# Altium footprint library Transformers.PcbLib: 102 footprints (part 3 of 7)
Each footprint in its own frame and in the unit in brackets; x right, y up, seen from the top. Pads: shape width x height; smd on the part's side, far side on the other; paste and mask are expansions set on the pad; w line width, h text height; cw(c..) or ccw(c..) is an arc to the next point about the centre after c.
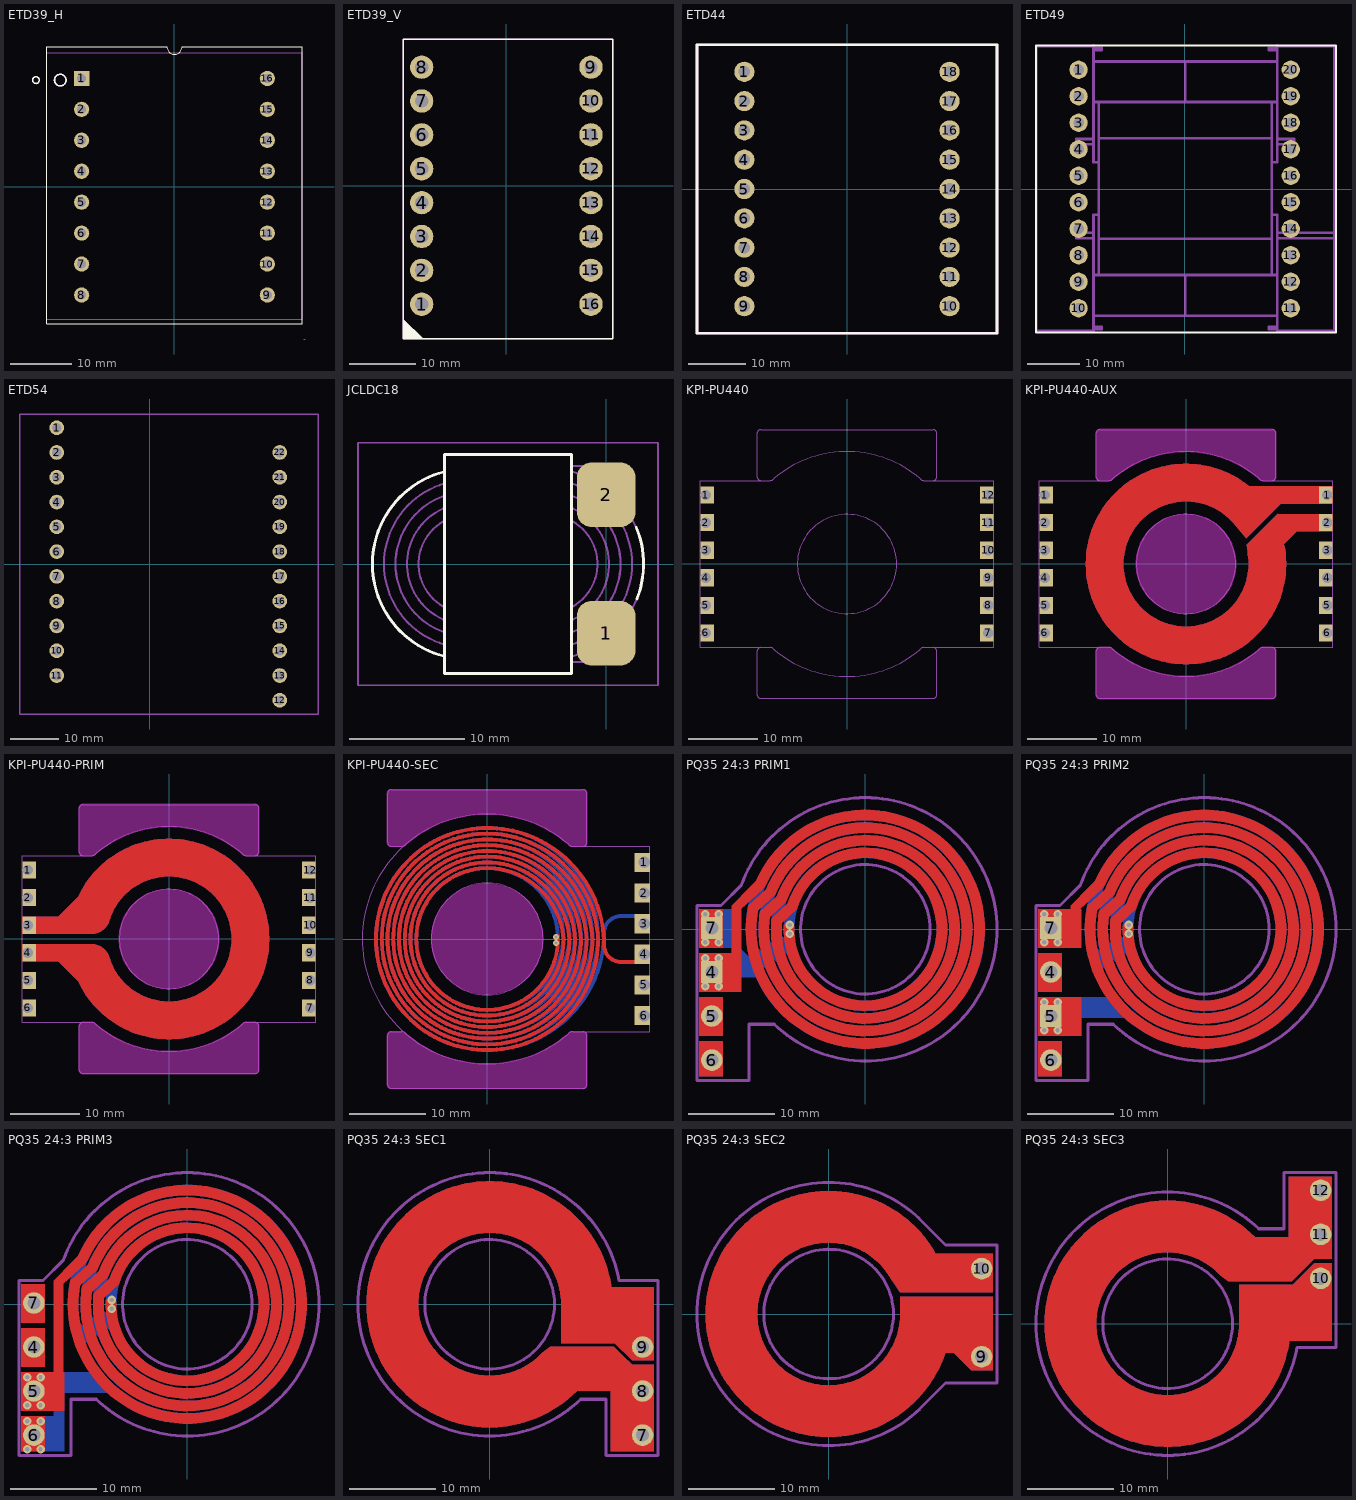
[diagram p2: the footprints below, top view; thin cyan lines are the x and y axes]

## ETD39_H [mm] "THT, Body 41.90X49.0mm, 16Pins,Pitch 5.0mm"
height 31.75
pads (16):
  rect 2.5x2.5 hole 1.5: 1(-15.24,17.78)
  round 2.5 hole 1.5: 2(-15.24,12.7) 3(-15.24,7.62) 4(-15.24,2.54) 5(-15.24,-2.54) 6(-15.24,-7.62) 7(-15.24,-12.7) 8(-15.24,-17.78) 9(15.24,-17.78) 10(15.24,-12.7) 11(15.24,-7.62) 12(15.24,-2.54) 13(15.24,2.54) 14(15.24,7.62) 15(15.24,12.7) 16(15.24,17.78)
Top Overlay:
  circle w0.254: c-22.75,17.5 r0.552
  circle w0.254: c-18.75,17.5 r0.95
  lines w0.2: -21,-22.5 -21,23 -1.25,23 ccw(c0,23) 1.25,23 21,23 21,-22.5 -21,-22.5
Top Assembly:
  circle w0.254: c-18.75,17.5 r0.95
  lines w0.2: -21,-21.75 21,-21.75 21,22 -21,22 -21,-21.75
Top Component Outline (Mech15):
  lines w0.2: 21.25,-25 21.5,-25
3D body "070-5724.stp": height 32.31, standoff -3.79, extent -20.5,-21.25 20.5,21.45

## ETD39_V [mm]
pads (16):
  round 3.5 hole 2 paste-25.4: 1(-12.7,-17.78) 2(-12.7,-12.7) 3(-12.7,-7.62) 4(-12.7,-2.54) 5(-12.7,2.54) 6(-12.7,7.62) 7(-12.7,12.7) 8(-12.7,17.78) 9(12.7,17.78) 10(12.7,12.7) 11(12.7,7.62) 12(12.7,2.54) 13(12.7,-2.54) 14(12.7,-7.62) 15(12.7,-12.7) 16(12.7,-17.78)
Top Overlay:
  region: -15.5,-20 -12.5,-23 -13.5,-23 -15.5,-23
  lines w0.2: -15.5,-23 16,-23 16,22 -15.5,22 -15.5,-23
Top Assembly:
  region: -15.5,-20 -12.5,-23 -13.5,-23 -15.5,-23
  lines w0.2: -15.5,-23 -15.5,22 16,22 16,-23 -15.5,-23
3D body "ETD39[ver].SLDPRT": height 53.92, standoff -0.55, extent -14,-22.02 14.4,21.78

## ETD44 [mm]
pads (18):
  round 3.5 hole 2 unplated: 1(-17.78,20.32) 2(-17.78,15.24) 3(-17.78,10.16) 4(-17.78,5.08) 5(-17.78,0) 6(-17.78,-5.08) 7(-17.78,-10.16) 8(-17.78,-15.24) 9(-17.78,-20.32) 10(17.78,-20.32) 11(17.78,-15.24) 12(17.78,-10.16) 13(17.78,-5.08) 14(17.78,0) 15(17.78,5.08) 16(17.78,10.16) 17(17.78,15.24) 18(17.78,20.32)
Top Overlay:
  lines w0.5: -26,-25 26,-25 26,25 -26,25 -26,-25
Top Assembly:
  lines w0.5: -26,-25 -26,25 26,25 26,-25 -26,-25
3D body "ETD44 Transformer assembly.STEP": height 40.51, standoff -3.75, extent -26.1,-24.8 26.1,24.8

## ETD49 [mm]
pads (20):
  round 3.5 hole 2: 1(-20.32,22.86) 2(-20.32,17.78) 3(-20.32,12.7) 4(-20.32,7.62) 5(-20.32,2.54) 6(-20.32,-2.54) 7(-20.32,-7.62) 8(-20.32,-12.7) 9(-20.32,-17.78) 10(-20.32,-22.86) 11(20.32,-22.86) 12(20.32,-17.78) 13(20.32,-12.7) 14(20.32,-7.62) 15(20.32,-2.54) 16(20.32,2.54) 17(20.32,7.62) 18(20.32,12.7) 19(20.32,17.78) 20(20.32,22.86)
Top Overlay:
  lines w0.3: -28.5,-27.5 -28.5,27.5 29,27.5 29,-27.5 -28.5,-27.5
Top Assembly:
  lines w0.5: -17.667,-27.158 -17.48,-27.258 -17.48,-27.158 ; -17.667,27.342 -17.48,27.442 -17.48,27.342 ; -17.48,-26.858 -15.88,-26.858 -15.88,-26.458 -17.48,-26.458 ; -17.48,-24.258 0.12,-24.258 ; -17.48,-16.491 0.12,-16.491 ; -17.48,-9.408 -20.78,-9.408 -20.78,-8.408 -17.48,-8.408 ; -17.48,8.592 -20.78,8.592 -20.78,9.592 -17.48,9.592 ; -17.48,16.676 0.12,16.676 ; -17.48,24.442 0.12,24.442 ; -17.48,26.642 -15.88,26.642 -15.88,27.042 -17.48,27.042 ; -16.48,-16.491 -16.48,-4.908 ; -16.48,-9.508 16.72,-9.508 ; -16.48,9.692 16.72,9.692 ; -16.48,16.676 -16.48,5.092 ; 16.72,-16.491 16.72,-4.908 ; 16.72,16.676 16.72,5.092 ; 17.72,-26.858 16.12,-26.858 16.12,-26.458 17.72,-26.458 ; 17.72,-24.258 0.12,-24.258 ; 17.72,-16.491 0.12,-16.491 ; 17.72,-9.408 28.72,-9.408 ; 17.72,-8.408 28.72,-8.408 ; 17.72,8.592 21.02,8.592 21.02,9.592 17.72,9.592 ; 17.72,16.676 0.12,16.676 ; 17.72,24.442 0.12,24.442 ; 17.72,26.642 16.12,26.642 16.12,27.042 17.72,27.042 ; 17.908,-27.158 17.72,-27.258 17.72,-27.158 ; 17.908,27.342 17.72,27.442 17.72,27.342 ; -17.48,-27.158 -28.48,-27.158 -28.48,27.342 -17.48,27.342 ; -17.48,-27.158 -17.48,-14.394 -17.48,-4.908 -16.48,-4.908 ; -17.48,27.342 -17.48,14.578 -17.48,5.092 -16.48,5.092 ; -16.48,-4.908 -16.48,5.092 ; 0.12,-24.258 0.12,-16.491 ; 0.12,16.676 0.12,24.442 ; 16.72,-4.908 16.72,5.092 ; 16.72,-4.908 17.72,-4.908 17.72,-14.394 17.72,-27.158 ; 16.72,5.092 17.72,5.092 17.72,14.578 17.72,27.342 ; 17.72,-27.158 28.72,-27.158 28.72,-9.408 ; 17.72,27.342 28.72,27.342 28.72,-8.408 ; 28.72,-9.408 28.72,-8.408
3D body "User Library-ETD49_NO_AIRGAP.STEP": height 40.74, standoff -3.86, extent -28.6,-27.35 28.6,27.35

## ETD54 [mm]
pads (22):
  round 3 hole 2: 1(-19.05,27.94) 2(-19.05,22.86) 3(-19.05,17.78) 4(-19.05,12.7) 5(-19.05,7.62) 6(-19.05,2.54) 7(-19.05,-2.54) 8(-19.05,-7.62) 9(-19.05,-12.7) 10(-19.05,-17.78) 11(-19.05,-22.86) 12(26.67,-27.94) 13(26.67,-22.86) 14(26.67,-17.78) 15(26.67,-12.7) 16(26.67,-7.62) 17(26.67,-2.54) 18(26.67,2.54) 19(26.67,7.62) 20(26.67,12.7) 21(26.67,17.78) 22(26.67,22.86)
Top Assembly:
  lines w0.3: -26.67,-30.75 -26.67,30.75 34.6,30.75 34.6,-30.75 -26.67,-30.75
3D body "ETD54-K-H-22P-FUAN.STEP": height 45.55, standoff -4.2, extent -26.6,-30.75 34.6,30.75
3D body "ER64-25.4-50.8A.STEP": height 25.4, standoff -25.4, extent 53.2,26.2 117.2,38.9

## JCLDC18 [mm]
pads (2):
  rrect50% 5.08x5.588 smd: 1(0,-6) 2(0,6)
Top Overlay:
  lines w0.254: -13.995,-8.001 cw(c-12,0) -13.995,8.001 ; 2.613,3.169 cw(c-5,0) 2.662,-3.049 ; -14,-9.5 -3,-9.5 -3,9.5 -14,9.5 -14,-9.5
Top Assembly:
  lines w0.178: -14.134,-4.792 cw(c-12,0) -14.134,4.792 ; -14.104,-3.688 cw(c-12,0) -14.104,3.688 ; -13.995,-8.001 cw(c-12,0) -13.995,8.001 ; -13.985,-6.969 cw(c-12,0) -13.985,6.969 ; -13.972,-5.927 cw(c-12,0) -13.972,5.927 ; -3.028,-5.927 ccw(c-5,0) -3.028,5.927 ; -3.015,-6.969 ccw(c-5,0) -3.015,6.969 ; -3.005,-8.001 ccw(c-5,0) -3.005,8.001 ; -3,-8.5 1.5,-8.5 2,-8.5 2,-4.5 ; -3,8.5 2,8.5 2,4.5 ; -2.896,-3.688 ccw(c-5,0) -2.896,3.688 ; -2.866,-4.792 ccw(c-5,0) -2.866,4.792 ; -14,-9.5 -3,-9.5 -3,9.5 -14,9.5 -14,-9.5
Top Component Outline (Mech15):
  lines w0.15: -21.5,-10.5 4.5,-10.5 4.5,10.5 -21.5,10.5 -21.5,-10.5
3D body: height 5, standoff 1, extent -20.027,-7.5 2.973,0
3D body: height 5, standoff 1, extent -20,0 3,7.5
3D body: height 6, standoff 0.5, extent -14,-9.5 -3,9.5

## KPI-PU440 [mm]
pads (12):
  rect 2x2.5 hole 1.5 copper offset 0.25,0: 1(-20.5,10) 2(-20.5,6) 3(-20.5,2) 4(-20.5,-2) 5(-20.5,-6) 6(-20.5,-10)
  rect 2x2.5 hole 1.5 copper offset -0.25,0: 7(20.5,-10) 8(20.5,-6) 9(20.5,-2) 10(20.5,2) 11(20.5,6) 12(20.5,10)
Mechanical 2:
  circle w0.15: c0,0 r7.2
  lines w0.15: -0.251,-16.298 ccw(c0,0) 10.562,-12.415 10.679,-12.299 ; -0.251,16.298 cw(c0,0) 10.562,12.415 10.679,12.299 ; 0.251,-16.298 cw(c0,0) -10.562,-12.415 -10.679,-12.299 ccw(c-11.15,-12.771) -11.15,-12.103 -12.501,-12.103 -21.25,-12.103 -21.25,12.103 -12.501,12.103 -11.15,12.103 ccw(c-11.15,12.771) -10.679,12.299 -10.562,12.416 cw(c0,0) 0.251,16.298 ; 21.3,-0.5 21.3,12.103 12.501,12.103 ; 21.3,0.5 21.3,-12.103 12.501,-12.103 ; 10.679,-12.299 cw(c11.15,-12.771) 11.15,-12.103 ; 10.679,-12.299 cw(c11.15,-12.771) 11.15,-12.103 ; 10.679,12.299 ccw(c11.15,12.771) 11.15,12.103 ; 10.679,12.299 ccw(c11.15,12.771) 11.15,12.103 ; 11.15,-12.103 12.501,-12.103 ; 11.15,-12.103 12.501,-12.103 ; 11.15,12.103 12.501,12.103 ; 11.15,12.103 12.501,12.103
Top Assembly:
  circle w0.15: c0,0 r7.2
  lines w0.15: -0.251,16.298 cw(c0,0) 10.561,12.416 10.678,12.299 ccw(c11.15,12.771) 11.15,12.103 12.5,12.103 ccw(c12.5,12.603) 13,12.603 13,19 ccw(c12.5,19) 12.5,19.5 -12.5,19.5 ccw(c-12.5,19) -13,19 -13,12.603 ccw(c-12.5,12.603) -12.5,12.103 -11.15,12.103 ccw(c-11.15,12.771) -10.679,12.299 -10.562,12.416 cw(c0,0) 0.251,16.298 ; -13,-19 ccw(c-12.5,-19) -12.5,-19.5 ; -13,-19 ccw(c-12.5,-19) -12.5,-19.5 ; -13,-19 -13,-12.603 ; -13,-19 -13,-12.603 ; -13,-12.603 cw(c-12.5,-12.603) -12.5,-12.103 ; -13,-12.603 cw(c-12.5,-12.603) -12.5,-12.103 ; -12.5,-19.5 12.5,-19.5 ; -12.5,-19.5 12.5,-19.5 ; -12.5,-12.103 -11.15,-12.103 ; -12.5,-12.103 -11.15,-12.103 ; -11.15,-12.103 cw(c-11.15,-12.771) -10.679,-12.299 ; -11.15,-12.103 cw(c-11.15,-12.771) -10.679,-12.299 ; -10.679,-12.299 -10.562,-12.416 ; -10.679,-12.299 -10.562,-12.416 ; -10.561,-12.416 ccw(c0,0) 0.251,-16.298 cw(c0,0) -10.561,-12.416 ; 10.561,-12.416 cw(c0,0) -0.251,-16.298 ccw(c0,0) 10.561,-12.416 ; 10.561,-12.416 10.678,-12.299 ; 10.561,-12.416 10.678,-12.299 ; 10.678,-12.299 cw(c11.15,-12.771) 11.15,-12.103 ; 10.678,-12.299 cw(c11.15,-12.771) 11.15,-12.103 ; 11.15,-12.103 12.5,-12.103 ; 11.15,-12.103 12.5,-12.103 ; 12.5,-19.5 ccw(c12.5,-19) 13,-19 ; 12.5,-19.5 ccw(c12.5,-19) 13,-19 ; 12.5,-12.103 cw(c12.5,-12.603) 13,-12.603 ; 12.5,-12.103 cw(c12.5,-12.603) 13,-12.603 ; 13,-19 13,-12.603 ; 13,-19 13,-12.603
3D body "ER38.1-16-25.STEP": height 17, standoff 9, extent -12.7,-19.05 12.7,19.05
3D body "ER38.1-16-25.STEP": height -2, standoff -10, extent -12.7,-19.05 12.7,19.05

## KPI-PU440-AUX [mm]
pads (12):
  rect 2x2.5 hole 1.5 copper offset 0.25,0: 1(-20.5,10) 2(-20.5,6) 3(-20.5,2) 4(-20.5,-2) 5(-20.5,-6) 6(-20.5,-10)
  rect 2x2.5 hole 1.5 copper offset -0.25,0: 1(20.5,10) 2(20.5,6) 3(20.5,2) 4(20.5,-2) 5(20.5,-6) 6(20.5,-10)
Top Layer:
  region: 13.275,7.25 21.3,7.25 21.3,4.75 16.025,4.75 12.075,0.8 9.117,0.8 8.839,2.814
  region: 6.882,6 8.7,3.7 13.75,8.75 21.3,8.75 21.3,11.25 8.828,11.25 8.7,10.325
  lines w5.5: 8.837,7.82 ccw(c0,0) 0,11.8 ccw(c0,0) -11.8,0 ccw(c0,0) 0,-11.8 ccw(c0,0) 11.666,1.776
  text "5" at -18,11 h1.5
Bottom Layer:
  region: 6.882,6 8.7,3.7 13.75,8.75 21.3,8.75 21.3,11.25 8.828,11.25 8.7,10.325
  region: 13.275,7.25 21.3,7.25 21.3,4.75 16.025,4.75 12.075,0.8 9.117,0.8 8.839,2.814
  lines w5.5: 8.837,7.82 ccw(c0,0) 0,11.8 ccw(c0,0) -11.8,0 ccw(c0,0) 0,-11.8 ccw(c0,0) 11.666,1.776
Keep-Out Layer:
  drawing of 3 lines, arcs and shapes, not listed
Mechanical 2:
  circle w0.15: c0,0 r7.2
  lines w0.15: -0.251,-16.298 ccw(c0,0) 10.562,-12.415 10.679,-12.299 ; -0.251,16.298 cw(c0,0) 10.562,12.415 10.679,12.299 ; 0.251,-16.298 cw(c0,0) -10.562,-12.415 -10.679,-12.299 ccw(c-11.15,-12.771) -11.15,-12.103 -12.501,-12.103 -21.25,-12.103 -21.25,12.103 -12.501,12.103 -11.15,12.103 ccw(c-11.15,12.771) -10.679,12.299 -10.562,12.416 cw(c0,0) 0.251,16.298 ; 21.3,-0.5 21.3,12.103 12.501,12.103 ; 21.3,0.5 21.3,-12.103 12.501,-12.103 ; 10.679,-12.299 cw(c11.15,-12.771) 11.15,-12.103 ; 10.679,-12.299 cw(c11.15,-12.771) 11.15,-12.103 ; 10.679,12.299 ccw(c11.15,12.771) 11.15,12.103 ; 10.679,12.299 ccw(c11.15,12.771) 11.15,12.103 ; 11.15,-12.103 12.501,-12.103 ; 11.15,-12.103 12.501,-12.103 ; 11.15,12.103 12.501,12.103 ; 11.15,12.103 12.501,12.103
Top Assembly:
  circle w0.15: c0,0 r7.2
  lines w0.15: -0.251,16.298 cw(c0,0) 10.561,12.416 10.678,12.299 ccw(c11.15,12.771) 11.15,12.103 12.5,12.103 ccw(c12.5,12.603) 13,12.603 13,19 ccw(c12.5,19) 12.5,19.5 -12.5,19.5 ccw(c-12.5,19) -13,19 -13,12.603 ccw(c-12.5,12.603) -12.5,12.103 -11.15,12.103 ccw(c-11.15,12.771) -10.679,12.299 -10.562,12.416 cw(c0,0) 0.251,16.298 ; -13,-19 ccw(c-12.5,-19) -12.5,-19.5 ; -13,-19 ccw(c-12.5,-19) -12.5,-19.5 ; -13,-19 -13,-12.603 ; -13,-19 -13,-12.603 ; -13,-12.603 cw(c-12.5,-12.603) -12.5,-12.103 ; -13,-12.603 cw(c-12.5,-12.603) -12.5,-12.103 ; -12.5,-19.5 12.5,-19.5 ; -12.5,-19.5 12.5,-19.5 ; -12.5,-12.103 -11.15,-12.103 ; -12.5,-12.103 -11.15,-12.103 ; -11.15,-12.103 cw(c-11.15,-12.771) -10.679,-12.299 ; -11.15,-12.103 cw(c-11.15,-12.771) -10.679,-12.299 ; -10.679,-12.299 -10.562,-12.416 ; -10.679,-12.299 -10.562,-12.416 ; -10.561,-12.416 ccw(c0,0) 0.251,-16.298 cw(c0,0) -10.561,-12.416 ; 10.561,-12.416 cw(c0,0) -0.251,-16.298 ccw(c0,0) 10.561,-12.416 ; 10.561,-12.416 10.678,-12.299 ; 10.561,-12.416 10.678,-12.299 ; 10.678,-12.299 cw(c11.15,-12.771) 11.15,-12.103 ; 10.678,-12.299 cw(c11.15,-12.771) 11.15,-12.103 ; 11.15,-12.103 12.5,-12.103 ; 11.15,-12.103 12.5,-12.103 ; 12.5,-19.5 ccw(c12.5,-19) 13,-19 ; 12.5,-19.5 ccw(c12.5,-19) 13,-19 ; 12.5,-12.103 cw(c12.5,-12.603) 13,-12.603 ; 12.5,-12.103 cw(c12.5,-12.603) 13,-12.603 ; 13,-19 13,-12.603 ; 13,-19 13,-12.603
3D body "ER38.1-16-25.STEP": height 5, standoff -3, extent -12.7,-19.05 12.7,19.05

## KPI-PU440-PRIM [mm]
pads (12):
  rect 2x2.5 hole 1.5 copper offset 0.25,0: 1(-20.5,10) 2(-20.5,6) 3(-20.5,2) 4(-20.5,-2) 5(-20.5,-6) 6(-20.5,-10)
  rect 2x2.5 hole 1.5 copper offset -0.25,0: 7(20.5,-10) 8(20.5,-6) 9(20.5,-2) 10(20.5,2) 11(20.5,6) 12(20.5,10)
Top Layer:
  region: -10.751,0.749 -21.3,0.75 -21.3,3.25 -16.025,3.25 -12.075,7.2 -9.117,7.2 -8.533,2.967
  region: -10.751,-0.749 -21.3,-0.75 -21.3,-3.25 -16.025,-3.25 -12.075,-7.2 -9.117,-7.2 -8.533,-2.967
  lines w5.5: -11.269,-3.5 ccw(c0,0) 0,-11.8 ccw(c0,0) 11.8,0 ccw(c0,0) 0,11.8 ccw(c0,0) -11.267,3.505
  text "5" at -18,11 h1.5
Bottom Layer:
  region: -10.751,-0.749 -21.3,-0.75 -21.3,-3.25 -16.025,-3.25 -12.075,-7.2 -9.117,-7.2 -8.533,-2.967
  region: -10.751,0.749 -21.3,0.75 -21.3,3.25 -16.025,3.25 -12.075,7.2 -9.117,7.2 -8.533,2.967
  lines w5.5: -11.269,-3.5 ccw(c0,0) 0,-11.8 ccw(c0,0) 11.8,0 ccw(c0,0) 0,11.8 ccw(c0,0) -11.267,3.505
Keep-Out Layer:
  drawing of 3 lines, arcs and shapes, not listed
Mechanical 2:
  circle w0.15: c0,0 r7.2
  lines w0.15: -0.251,-16.298 ccw(c0,0) 10.562,-12.415 10.679,-12.299 ; -0.251,16.298 cw(c0,0) 10.562,12.415 10.679,12.299 ; 0.251,-16.298 cw(c0,0) -10.562,-12.415 -10.679,-12.299 ccw(c-11.15,-12.771) -11.15,-12.103 -12.501,-12.103 -21.25,-12.103 -21.25,12.103 -12.501,12.103 -11.15,12.103 ccw(c-11.15,12.771) -10.679,12.299 -10.562,12.416 cw(c0,0) 0.251,16.298 ; 21.3,-0.5 21.3,12.103 12.501,12.103 ; 21.3,0.5 21.3,-12.103 12.501,-12.103 ; 10.679,-12.299 cw(c11.15,-12.771) 11.15,-12.103 ; 10.679,-12.299 cw(c11.15,-12.771) 11.15,-12.103 ; 10.679,12.299 ccw(c11.15,12.771) 11.15,12.103 ; 10.679,12.299 ccw(c11.15,12.771) 11.15,12.103 ; 11.15,-12.103 12.501,-12.103 ; 11.15,-12.103 12.501,-12.103 ; 11.15,12.103 12.501,12.103 ; 11.15,12.103 12.501,12.103
Top Assembly:
  circle w0.15: c0,0 r7.2
  lines w0.15: -0.251,16.298 cw(c0,0) 10.561,12.416 10.678,12.299 ccw(c11.15,12.771) 11.15,12.103 12.5,12.103 ccw(c12.5,12.603) 13,12.603 13,19 ccw(c12.5,19) 12.5,19.5 -12.5,19.5 ccw(c-12.5,19) -13,19 -13,12.603 ccw(c-12.5,12.603) -12.5,12.103 -11.15,12.103 ccw(c-11.15,12.771) -10.679,12.299 -10.562,12.416 cw(c0,0) 0.251,16.298 ; -13,-19 ccw(c-12.5,-19) -12.5,-19.5 ; -13,-19 ccw(c-12.5,-19) -12.5,-19.5 ; -13,-19 -13,-12.603 ; -13,-19 -13,-12.603 ; -13,-12.603 cw(c-12.5,-12.603) -12.5,-12.103 ; -13,-12.603 cw(c-12.5,-12.603) -12.5,-12.103 ; -12.5,-19.5 12.5,-19.5 ; -12.5,-19.5 12.5,-19.5 ; -12.5,-12.103 -11.15,-12.103 ; -12.5,-12.103 -11.15,-12.103 ; -11.15,-12.103 cw(c-11.15,-12.771) -10.679,-12.299 ; -11.15,-12.103 cw(c-11.15,-12.771) -10.679,-12.299 ; -10.679,-12.299 -10.562,-12.416 ; -10.679,-12.299 -10.562,-12.416 ; -10.561,-12.416 ccw(c0,0) 0.251,-16.298 cw(c0,0) -10.561,-12.416 ; 10.561,-12.416 cw(c0,0) -0.251,-16.298 ccw(c0,0) 10.561,-12.416 ; 10.561,-12.416 10.678,-12.299 ; 10.561,-12.416 10.678,-12.299 ; 10.678,-12.299 cw(c11.15,-12.771) 11.15,-12.103 ; 10.678,-12.299 cw(c11.15,-12.771) 11.15,-12.103 ; 11.15,-12.103 12.5,-12.103 ; 11.15,-12.103 12.5,-12.103 ; 12.5,-19.5 ccw(c12.5,-19) 13,-19 ; 12.5,-19.5 ccw(c12.5,-19) 13,-19 ; 12.5,-12.103 cw(c12.5,-12.603) 13,-12.603 ; 12.5,-12.103 cw(c12.5,-12.603) 13,-12.603 ; 13,-19 13,-12.603 ; 13,-19 13,-12.603
3D body "ER38.1-16-25.STEP": height 5, standoff -3, extent -12.7,-19.05 12.7,19.05

## KPI-PU440-SEC [mm]
pads (6):
  rect 2x2.5 hole 1.5 copper offset -0.25,0: 1(20.5,10) 2(20.5,6) 3(20.5,2) 4(20.5,-2) 5(20.5,-6) 6(20.5,-10)
via 9,0.25 diameter 0.8 hole 0.4
via 9,-0.5 diameter 0.8 hole 0.4
Top Layer:
  lines w0.5: 9.179,0.397 cw(c0,-0.75) 9.247,-0.5 ; 9.236,-0.499 cw(c0,0) 0,-9.25 cw(c0,0) -9.25,0 cw(c0,0) 0,9.25 cw(c0,-0.75) 9.972,-0.002 ; 10,0 cw(c0,0) 0,-10 cw(c0,0) -10,0 cw(c0,0) 0,10 cw(c0,-0.75) 10.724,-0.002 ; 10.75,0 cw(c0,0) 0,-10.75 cw(c0,0) -10.75,0 cw(c0,0) 0,10.75 cw(c0,-0.75) 11.476,-0.002 ; 11.5,0 cw(c0,0) 0,-11.5 cw(c0,0) -11.5,0 cw(c0,0) 0,11.5 cw(c0,-0.75) 12.227,-0.001 ; 12.25,0 cw(c0,0) 0,-12.25 cw(c0,0) -12.25,0 cw(c0,0) 0,12.25 cw(c0,-0.75) 12.978,-0.001 ; 13,0 cw(c0,0) 0,-13 cw(c0,0) -13,0 cw(c0,0) 0,13 cw(c0,-0.75) 13.73,-0.001 ; 13.75,0 cw(c0,0) 0,-13.75 cw(c0,0) -13.75,0 cw(c0,0) 0,13.75 cw(c0,-0.75) 14.481,-0.014 ; 14.5,0 cw(c0,0) 0,-14.5 cw(c0,0) -14.5,0 cw(c0,0) 0,14.5 cw(c0,-0.75) 15.25,-0.75 ccw(c17.5,-0.75) 17.5,-3 20.25,-3
Bottom Layer:
  lines w0.5: 9.179,-0.397 ccw(c0,0.75) 9.247,0.5 ; 9.236,0.499 ccw(c0,0) 0,9.25 ccw(c0,0) -9.25,0 ccw(c0,0) 0,-9.25 ccw(c0,0.75) 9.972,0.002 ; 10,0 ccw(c0,0) 0,10 ccw(c0,0) -10,0 ccw(c0,0) 0,-10 ccw(c0,0.75) 10.724,0.002 ; 10.75,0 ccw(c0,0) 0,10.75 ccw(c0,0) -10.75,0 ccw(c0,0) 0,-10.75 ccw(c0,0.75) 11.476,0.002 ; 11.5,0 ccw(c0,0) 0,11.5 ccw(c0,0) -11.5,0 ccw(c0,0) 0,-11.5 ccw(c0,0.75) 12.227,0.001 ; 12.25,0 ccw(c0,0) 0,12.25 ccw(c0,0) -12.25,0 ccw(c0,0) 0,-12.25 ccw(c0,0.75) 12.978,0.001 ; 13,0 ccw(c0,0) 0,13 ccw(c0,0) -13,0 ccw(c0,0) 0,-13 ccw(c0,0.75) 13.73,0.001 ; 13.75,0 ccw(c0,0) 0,13.75 ccw(c0,0) -13.75,0 ccw(c0,0) 0,-13.75 ccw(c0,0.75) 14.481,0.014 ; 14.5,0 ccw(c0,0) 0,14.5 ccw(c0,0) -14.5,0 ccw(c0,0) 0,-14.5 ccw(c0,0.75) 15.25,0.75 cw(c17.5,0.75) 17.5,3 20.25,3
Keep-Out Layer:
  drawing of 3 lines, arcs and shapes, not listed
Mechanical 2:
  circle w0.15: c0,0 r7.3
  lines w0.15: -0.251,-16.298 ccw(c0,0) 10.562,-12.415 10.679,-12.299 cw(c11.15,-12.771) 11.15,-12.103 12.501,-12.103 21.25,-12.103 21.25,-1 21.25,1.738 ; -0.251,16.298 cw(c0,0) 10.562,12.415 10.679,12.299 ccw(c11.15,12.771) 11.15,12.103 12.501,12.103 21.25,12.113 ; 0.251,-16.298 cw(c0,0) -10.561,12.416 cw(c0,0) 0.251,16.298 ; 21.25,1 21.25,12.104
Top Assembly:
  circle w0.15: c0,0 r7.3
  lines w0.15: -0.251,-16.298 ccw(c0,0) 10.562,-12.415 10.679,-12.299 cw(c11.15,-12.771) 11.15,-12.103 12.501,-12.103 cw(c12.5,-12.603) 13,-12.603 13,-19 cw(c12.5,-19) 12.5,-19.5 -12.5,-19.5 cw(c-12.5,-19) -13,-19 -13,-12.603 cw(c-12.5,-12.603) -12.5,-12.103 -11.15,-12.103 cw(c-11.15,-12.771) -10.678,-12.299 -10.561,-12.416 ccw(c0,0) 0.251,-16.298 ; -13,12.603 ccw(c-12.5,12.603) -12.5,12.103 ; -13,12.603 ccw(c-12.5,12.603) -12.5,12.103 ; -13,12.603 -13,19 ; -13,12.603 -13,19 ; -13,19 cw(c-12.5,19) -12.5,19.5 ; -13,19 cw(c-12.5,19) -12.5,19.5 ; -12.5,12.103 -11.15,12.103 ; -12.5,12.103 -11.15,12.103 ; -12.5,19.5 12.5,19.5 ; -12.5,19.5 12.5,19.5 ; -11.15,12.103 ccw(c-11.15,12.771) -10.678,12.299 ; -11.15,12.103 ccw(c-11.15,12.771) -10.678,12.299 ; -10.678,12.299 -10.561,12.416 ; -10.678,12.299 -10.561,12.416 ; -10.561,12.416 cw(c0,0) 0.251,16.298 ccw(c0,0) -10.561,12.416 ; 10.561,12.416 ccw(c0,0) -0.251,16.298 cw(c0,0) 10.561,12.416 ; 10.562,12.416 10.679,12.299 ; 10.562,12.416 10.679,12.299 ; 10.679,12.299 ccw(c11.15,12.771) 11.15,12.103 ; 10.679,12.299 ccw(c11.15,12.771) 11.15,12.103 ; 11.15,12.103 12.5,12.103 ; 11.15,12.103 12.5,12.103 ; 12.5,12.103 ccw(c12.5,12.603) 13,12.603 ; 12.5,12.103 ccw(c12.5,12.603) 13,12.603 ; 12.5,19.5 cw(c12.5,19) 13,19 ; 12.5,19.5 cw(c12.5,19) 13,19 ; 13,12.603 13,19 ; 13,12.603 13,19
3D body "ER38.1-16-25.STEP": height 7.5, standoff -0.5, extent -12.7,-19.05 12.7,19.05

## PQ35 24:3 PRIM1 [mm]
pads (4):
  rect 2.5x2.5 hole 1.5: 4(-17.773,-4.948) 7(-17.773,0.152)
  round 2.5 hole 1.5: 5(-17.773,-10.048) 6(-17.773,-15.148)
via -8.75,-0.5 diameter 1 hole 0.5
via -8.75,0.5 diameter 1 hole 0.5
via -18.546,-1.5 diameter 1 hole 0.5
via -18.546,1.75 diameter 1 hole 0.5
via -17,1.75 diameter 1 hole 0.5
via -17,-1.5 diameter 1 hole 0.5
via -18.546,-6.6 diameter 1 hole 0.5
via -18.546,-3.35 diameter 1 hole 0.5
via -17,-3.35 diameter 1 hole 0.5
via -17,-6.6 diameter 1 hole 0.5
Top Layer:
  region: 644 vertices and 0 holes, not listed, extent -15.5,-13.824 13.824,13.837
  region: -19.25,-12.95 -19.25,-17 -16.5,-17 -16.5,-12.95
  region: -19.25,-7.85 -19.25,-12.35 -16.5,-12.35 -16.5,-7.85
  region: -19.25,2.35 -19.25,-2.15 -16.5,-2.15 -16.5,2.35
  region: -19.25,-2.75 -19.25,-7.25 -16.5,-7.25 -16.5,-2.75
  region: -19.25,-2.75 -14.4,-2.75 -14.4,-7.25 -19.25,-7.25
Bottom Layer:
  region: -15.5,2.35 -15.5,-5.25 -15.181,-5.569 -12.652,-5.569 -12.652,-4.031 -14.5,-2.184 -14.5,2.35
  region: 649 vertices and 0 holes, not listed, extent -14.746,-13.837 13.824,13.824
  region: -19.25,-12.95 -19.25,-17 -16.5,-17 -16.5,-12.95
  region: -19.25,-7.85 -19.25,-12.35 -16.5,-12.35 -16.5,-7.85
  region: -19.25,2.35 -19.25,-2.15 -15,-2.15 -15,2.35
  region: -19.25,-2.75 -19.25,-7.25 -16.5,-7.25 -16.5,-2.75
  region: -19.25,2.35 -19.25,-2.15 -16.5,-2.15 -16.5,2.35
Mechanical 2:
  circle w0.35: c0,0 r7.5
  lines w0.35: -10.53,-11.031 ccw(c0,0) 0,-15.25 ccw(c0,0) 15.25,0 ccw(c0,0) 0,15.25 ccw(c0,0) -14.367,5.114 -16.731,2.75 -19.5,2.75 -19.5,-17.5 -13.5,-17.5 -13.5,-11 -10.53,-11

## PQ35 24:3 PRIM2 [mm]
pads (4):
  round 2.5 hole 1.5: 4(-17.773,-4.948) 6(-17.773,-15.148)
  rect 2.5x2.5 hole 1.5: 5(-17.773,-10.048) 7(-17.773,0.152)
via -17,-11.7 diameter 1 hole 0.5
via -17,-8.45 diameter 1 hole 0.5
via -18.546,-8.45 diameter 1 hole 0.5
via -18.546,-11.7 diameter 1 hole 0.5
via -18.546,-1.5 diameter 1 hole 0.5
via -18.546,1.75 diameter 1 hole 0.5
via -17,1.75 diameter 1 hole 0.5
via -17,-1.5 diameter 1 hole 0.5
via -8.75,-0.5 diameter 1 hole 0.5
via -8.75,0.5 diameter 1 hole 0.5
Top Layer:
  region: 643 vertices and 0 holes, not listed, extent -15.5,-13.824 13.824,13.837
  region: -19.25,-12.95 -19.25,-17 -16.5,-17 -16.5,-12.95
  region: -19.25,2.35 -19.25,-2.15 -14.25,-2.15 -14.25,2.35
  region: -19.25,-2.75 -19.25,-7.25 -16.5,-7.25 -16.5,-2.75
  region: -19.25,-7.85 -19.25,-12.35 -14.25,-12.35 -14.25,-7.85
Bottom Layer:
  region: -19.25,-12.95 -19.25,-17 -16.5,-17 -16.5,-12.95
  region: -19.25,-2.75 -19.25,-7.25 -16.5,-7.25 -16.5,-2.75
  region: -19.25,2.35 -19.25,-2.15 -16.5,-2.15 -16.5,2.35
  region: -19.25,-7.85 -19.25,-12.35 -14.25,-12.35 -14.25,-7.85
  region: 631 vertices and 0 holes, not listed, extent -13.832,-13.834 13.824,13.824
  region: -10,-7.85 -15,-7.85 -15,-10.25 -8.791,-10.25 -9.543,-8.55 -9.543,-8.439 -9.607,-8.225 -9.728,-8.039 -9.898,-7.895
  lines w1.2: -17.773,-10.048 -17.548,-10.048
Mechanical 2:
  circle w0.35: c0,0 r7.5
  lines w0.35: -10.53,-11.031 ccw(c0,0) 0,-15.25 ccw(c0,0) 15.25,0 ccw(c0,0) 0,15.25 ccw(c0,0) -14.367,5.114 -16.731,2.75 -19.5,2.75 -19.5,-17.5 -13.5,-17.5 -13.5,-11 -10.53,-11

## PQ35 24:3 PRIM3 [mm]
pads (4):
  round 2.5 hole 1.5: 4(-17.773,-4.948) 5(-17.773,-10.048) 6(-17.773,-15.148) 7(-17.773,0.152)
via -8.75,0.5 diameter 1 hole 0.5
via -8.75,-0.5 diameter 1 hole 0.5
via -18.546,-11.7 diameter 1 hole 0.5
via -18.546,-8.45 diameter 1 hole 0.5
via -17,-8.45 diameter 1 hole 0.5
via -17,-11.7 diameter 1 hole 0.5
via -18.546,-16.8 diameter 1 hole 0.5
via -18.546,-13.55 diameter 1 hole 0.5
via -17,-13.55 diameter 1 hole 0.5
via -17,-16.8 diameter 1 hole 0.5
Top Layer:
  region: -15.5,-8.832 -15.5,2.752 -15.425,2.812 -15.249,2.886 -15.059,2.908 -14.87,2.876 -14.698,2.794 -14.555,2.666 -14.453,2.504 -14.4,2.32 -14.4,2.225 -14.4,-8.5 -14.4,-8.597 -14.46,-8.78 -14.576,-8.936 -14.734,-9.047 -14.919,-9.103 -15.112,-9.098 -15.294,-9.032 -15.446,-8.913
  region: -19.25,-12.95 -19.25,-17 -16.5,-17 -16.5,-12.95
  region: -19.25,2.35 -19.25,-2.15 -16.5,-2.15 -16.5,2.35
  region: -19.25,-7.85 -19.25,-12.35 -16.5,-12.35 -16.5,-7.85
  region: -19.25,-2.75 -19.25,-7.25 -16.5,-7.25 -16.5,-2.75
  region: 644 vertices and 0 holes, not listed, extent -15.5,-13.824 13.824,13.837
  region: -19.25,-7.85 -19.25,-12.35 -14.25,-12.35 -14.25,-7.85
Bottom Layer:
  region: -10,-7.85 -15,-7.85 -15,-10.25 -8.791,-10.25 -9.543,-8.55 -9.543,-8.439 -9.607,-8.225 -9.728,-8.039 -9.898,-7.895
  region: 629 vertices and 0 holes, not listed, extent -13.832,-13.834 13.824,13.824
  region: -19.25,-12.95 -19.25,-17 -16.5,-17 -16.5,-12.95
  region: -19.25,-7.85 -19.25,-12.35 -16.5,-12.35 -16.5,-7.85
  region: -19.25,-2.75 -19.25,-7.25 -16.5,-7.25 -16.5,-2.75
  region: -19.25,2.35 -19.25,-2.15 -16.5,-2.15 -16.5,2.35
  region: -10,-7.85 -15,-7.85 -15.5,-7.85 -15.5,-13 -14.25,-13 -14.25,-9.25 -10,-9.25 -9.898,-9.205 -9.728,-9.061 -9.607,-8.875 -9.543,-8.661 -9.543,-8.439 -9.607,-8.225 -9.728,-8.039 -9.898,-7.895
  region: -19.25,-12.95 -14.25,-12.95 -14.25,-17 -19.25,-17
  lines w1.2: -17.773,-10.048 -17.548,-10.048
Mechanical 2:
  circle w0.35: c0,0 r7.5
  lines w0.35: -10.53,-11.031 ccw(c0,0) 0,-15.25 ccw(c0,0) 15.25,0 ccw(c0,0) 0,15.25 ccw(c0,0) -14.367,5.114 -16.731,2.75 -19.5,2.75 -19.5,-17.5 -13.5,-17.5 -13.5,-11 -10.53,-11

## PQ35 24:3 SEC1 [mm]
pads (3):
  round 2.5 hole 1.5: 7(17.727,-15.148) 8(17.727,-10.048) 9(17.727,-4.948)
Top Layer:
  rectangle: 16.5,-6.5 19,-3
  rectangle: 16.5,-17 19,-8.5
  region: 16.5,-6.5 14.5,-4.5 8.3,-4.5 8.3,2 19,2 19,-6.5
  region: 19,-17 14,-17 14,-10 10,-10 7,-7 6.1,-5.6 7,-4.9 14.4,-4.9 15.5,-6 16.5,-7 19,-7
  lines w6: 7.963,-7.963 cw(c0,0) 0,-11.262 cw(c0,0) -11.262,0 cw(c0,0) 0,11.262 cw(c0,0) 11.262,0
Bottom Layer:
  region: 19,-17 14,-17 14,-10 10,-10 7,-7 6.1,-5.6 7,-4.9 14.4,-4.9 15.5,-6 16.5,-7 19,-7
  region: 16.5,-6.5 14.5,-4.5 8.3,-4.5 8.3,2 19,2 19,-6.5
  lines w6: 7.963,-7.963 cw(c0,0) 0,-11.262 cw(c0,0) -11.262,0 cw(c0,0) 0,11.262 cw(c0,0) 11.262,0
Mechanical 2:
  circle w0.35: c0,0 r7.5
  lines w0.35: 10.53,-11.031 cw(c0,0) 0,-15.25 cw(c0,0) -15.25,0 cw(c0,0) 0,15.25 cw(c0,0) 15,2.75 19.5,2.75 19.5,-17.5 13.5,-17.5 13.5,-11 10.53,-11

## PQ35 24:3 SEC2 [mm]
pads (2):
  round 2.5 hole 1.5: 9(17.727,-4.948) 10(17.727,5.252)
Top Layer:
  rectangle: 16.5,2.5 19,7
  rectangle: 16.5,-6.5 19,-3
  region: 8.3,7 7.5,3.75 8.3,2.5 19,2.5 19,7
  region: 16.5,-6.5 14.5,-4.5 8.3,-4.5 8.3,2 19,2 19,-6.5
  lines w6: 9.809,5.533 ccw(c0,0) 0,11.262 ccw(c0,0) -11.262,0 ccw(c0,0) 0,-11.262 ccw(c0,0) 11.201,-1.167
Bottom Layer:
  region: 16.5,-6.5 14.5,-4.5 8.3,-4.5 8.3,2 19,2 19,-6.5
  region: 8.3,7 7.481,3.673 8.232,2.5 19,2.5 19,7
  lines w6: 9.809,5.533 ccw(c0,0) 0,11.262 ccw(c0,0) -11.262,0 ccw(c0,0) 0,-11.262 ccw(c0,0) 11.201,-1.167
Mechanical 2:
  circle w0.35: c0,0 r7.5
  lines w0.35: 10.53,-11 13.53,-8 19.5,-8 19.5,8 13.53,8 10.53,11 ; 10.53,11.031 ccw(c0,0) 0,15.25 ccw(c0,0) -15.25,0 ccw(c0,0) 0,-15.25 ccw(c0,0) 10.545,-11.016

## PQ35 24:3 SEC3 [mm]
pads (3):
  round 2.5 hole 1.5: 10(17.727,5.252) 11(17.727,10.352) 12(17.727,15.452)
Top Layer:
  rectangle: 16.5,9 19,17
  region: 19,7 17,7 16.5,6.5 16.5,2.5 19,2.5
  region: 17,7 14.5,4.5 8.3,4.5 8.3,-2 19,-2 19,7
  region: 19,17 14,17 14,10 10,10 7,7 6.1,5.6 7,4.9 14.4,4.9 15.5,6 17,7.5 19,7.5
  lines w6: 7.963,7.963 ccw(c0,0) 0,11.262 ccw(c0,0) -11.262,0 ccw(c0,0) 0,-11.262 ccw(c0,0) 11.262,0
Bottom Layer:
  region: 19,17 14,17 14,10 10,10 7,7 6.1,5.6 7,4.9 14.4,4.9 15.5,6 17,7.5 19,7.5
  region: 17,7 14.5,4.5 8.3,4.5 8.3,-2 19,-2 19,7
  lines w6: 7.963,7.963 ccw(c0,0) 0,11.262 ccw(c0,0) -11.262,0 ccw(c0,0) 0,-11.262 ccw(c0,0) 11.262,0
Mechanical 2:
  circle w0.35: c0,0 r7.5
  lines w0.35: 10.53,11 13.5,11 13.5,17.5 19.5,17.5 19.5,-2.75 15,-2.75 cw(c0,0) 0,-15.25 cw(c0,0) -15.25,0 cw(c0,0) 0,15.25 cw(c0,0) 10.53,11.031